# Altium footprint library PcbLib1.PcbLib: 54 footprints (part 2 of 4)
Each footprint in its own frame and in the unit in brackets; x right, y up, seen from the top. Pads: shape width x height; smd on the part's side, far side on the other; paste and mask are expansions set on the pad; w line width, h text height; cw(c..) or ccw(c..) is an arc to the next point about the centre after c.
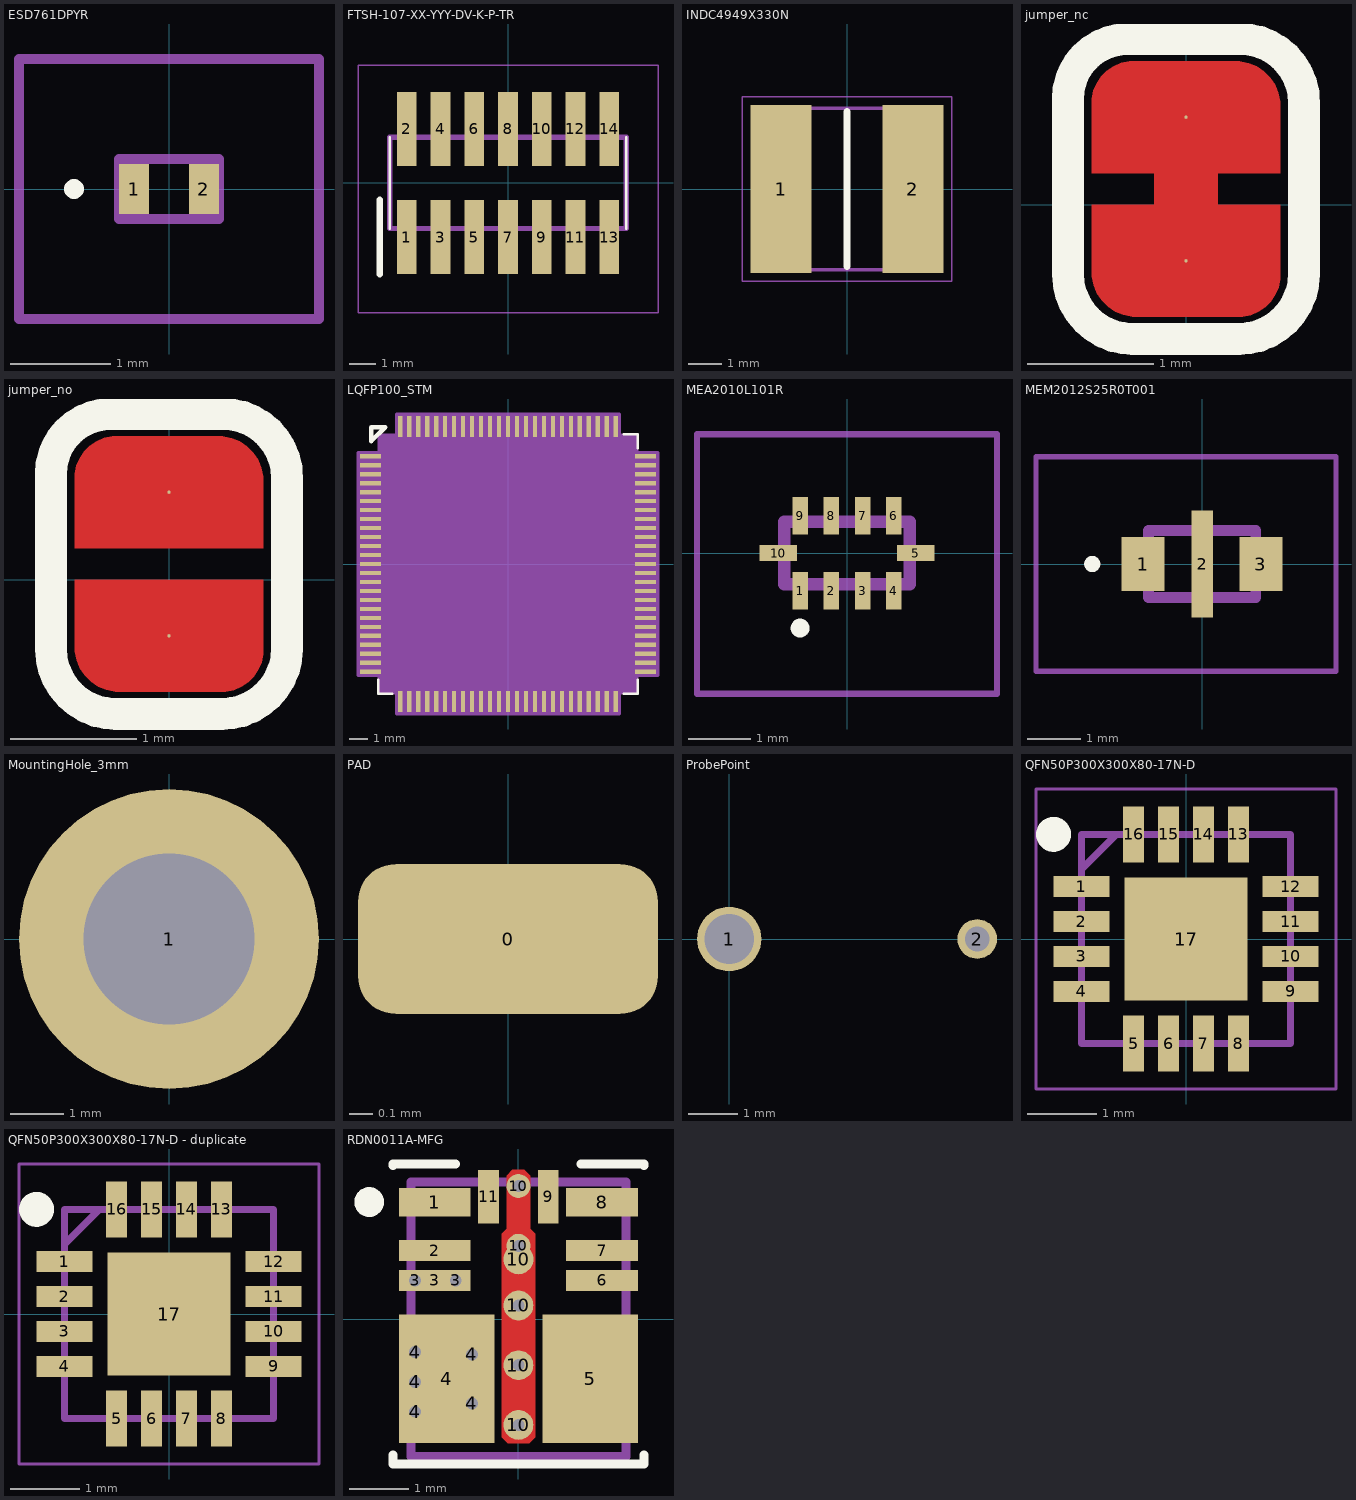
[diagram p1: the footprints below, top view; thin cyan lines are the x and y axes]

## ESD761DPYR [mm]
pads (2):
  rect 0.3x0.5 smd: 1(-0.35,0) 2(0.35,0)
Top Overlay:
  lines w0.1: -1,0 ccw(c-0.95,0) -0.9,0 ccw(c-0.95,0) -1,0
Mechanical 13:
  lines w0.1: -0.5,-0.3 0.5,-0.3 0.5,0.3 -0.5,0.3 -0.5,-0.3
Mechanical 15:
  lines w0.1: -1.5,-1.3 1.5,-1.3 1.5,1.3 -1.5,1.3 -1.5,-1.3
3D body "ESD761DPYR.stp": height 0.55, standoff 0, extent -0.5,-0.3 0.5,0.3

## FTSH-107-XX-YYY-DV-K-P-TR [mm]
pads (14):
  rect 0.74x2.79 smd: 1(-3.81,-2.035) 2(-3.81,2.035) 3(-2.54,-2.035) 4(-2.54,2.035) 5(-1.27,-2.035) 6(-1.27,2.035) 7(0,-2.035) 8(0,2.035) 9(1.27,-2.035) 10(1.27,2.035) 11(2.54,-2.035) 12(2.54,2.035) 13(3.81,-2.035) 14(3.81,2.035)
Top Overlay:
  lines w0.1: -4.445,-1.715 -4.445,1.715 ; 4.445,-1.715 4.445,1.715
  lines w0.254: -4.826,-3.429 -4.826,-0.635
Mechanical 13:
  lines w0.2: -4.445,-1.715 -4.445,1.715 4.445,1.715 4.445,-1.715 -4.445,-1.715
Mechanical 15:
  lines w0.05: -5.645,-4.885 -5.645,4.43 5.645,4.43 5.645,-4.885 -5.645,-4.885
3D body "FTSH-107-01-F-DV-K-P-TR.stp": height 6.99, standoff 0, extent -4.445,-4.425 4.445,2.941

## INDC4949X330N [mm]
pads (2):
  rect 1.85x5.1 smd: 1(-2,0) 2(2,0)
Top Overlay:
  lines w0.2: 0,-2.35 0,2.35
Mechanical 13:
  lines w0.1: -2.45,-2.45 -2.45,2.45 2.45,2.45 2.45,-2.45 -2.45,-2.45
Mechanical 15:
  lines w0.05: -3.175,-2.8 -3.175,2.8 3.175,2.8 3.175,-2.8 -3.175,-2.8
3D body "NRS5030T3R3MMGJ.stp": height 3.3, standoff 0, extent -2.45,-2.45 2.45,2.45

## jumper_nc [mil]
pads (2):
  round 1 smd: 1(0,27.5) 2(0,-17.5)
Top Layer:
  region: -10,-10 -10,20 10,20 10,-10
  region: 29.5,10 -29.5,10 -29.5,32 -29.5,33.28 -29,35.79 -28.02,38.16 -26.6,40.29 -24.79,42.1 -22.66,43.52 -20.29,44.5 -17.78,45 -16.5,45 15.5,45 16.88,45 19.58,44.46 22.13,43.41 24.42,41.87 26.37,39.92 27.91,37.63 28.96,35.08 29.5,32.38 29.5,31
  region: -29.5,0 29.5,0 29.5,-22 29.5,-23.28 29,-25.79 28.02,-28.16 26.6,-30.29 24.79,-32.1 22.66,-33.52 20.29,-34.5 17.78,-35 16.5,-35 -15.5,-35 -16.88,-35 -19.58,-34.46 -22.13,-33.41 -24.42,-31.87 -26.37,-29.92 -27.91,-27.63 -28.96,-25.08 -29.5,-22.38 -29.5,-21
Top Overlay:
  lines w10: -37,5 -37,-21.63 ccw(c-16.63,-21.63) -16.63,-42 16.51,-42 ccw(c16.51,-21.51) 37,-21.51 37,32 ccw(c17,32) 17,52 -18.25,52 ccw(c-18.25,33.25) -37,33.25 -37,6

## jumper_no [mil]
pads (2):
  round 1 smd: 1(0,27.5) 2(0,-17.5)
Top Layer:
  region: -29.5,0 29.5,0 29.5,-22 29.5,-23.28 29,-25.79 28.02,-28.16 26.6,-30.29 24.79,-32.1 22.66,-33.52 20.29,-34.5 17.78,-35 16.5,-35 -15.5,-35 -16.88,-35 -19.58,-34.46 -22.13,-33.41 -24.42,-31.87 -26.37,-29.92 -27.91,-27.63 -28.96,-25.08 -29.5,-22.38 -29.5,-21
  region: 29.5,10 -29.5,10 -29.5,32 -29.5,33.28 -29,35.79 -28.02,38.16 -26.6,40.29 -24.79,42.1 -22.66,43.52 -20.29,44.5 -17.78,45 -16.5,45 15.5,45 16.88,45 19.58,44.46 22.13,43.41 24.42,41.87 26.37,39.92 27.91,37.63 28.96,35.08 29.5,32.38 29.5,31
Top Overlay:
  lines w10: -37,5 -37,-21.63 ccw(c-16.63,-21.63) -16.63,-42 16.51,-42 ccw(c16.51,-21.51) 37,-21.51 37,32 ccw(c17,32) 17,52 -18.25,52 ccw(c-18.25,33.25) -37,33.25 -37,6

## LQFP100_STM [mil]
pads (100):
  rect 46x9 smd paste+0 mask+0: 1(-302,236.22) 2(-302,216.54) 3(-302,196.85) 4(-302,177.17) 5(-302,157.48) 6(-302,137.8) 7(-302,118.11) 8(-302,98.43) 9(-302,78.74) 10(-302,59.06) 11(-302,39.37) 12(-302,19.69) 13(-302,0) 14(-302,-19.68) 15(-302,-39.37) 16(-302,-59.06) 17(-302,-78.74) 18(-302,-98.43) 19(-302,-118.11) 20(-302,-137.8) 21(-302,-157.48) 22(-302,-177.17) 23(-302,-196.85) 24(-302,-216.54) 25(-302,-236.22) 51(302,-236.22) 52(302,-216.54) 53(302,-196.85) 54(302,-177.17) 55(302,-157.48) 56(302,-137.8) 57(302,-118.11) 58(302,-98.43) 59(302,-78.74) 60(302,-59.06) 61(302,-39.37) 62(302,-19.68) 63(302,0) 64(302,19.68) 65(302,39.37) 66(302,59.06) 67(302,78.74) 68(302,98.43) 69(302,118.11) 70(302,137.8) 71(302,157.48) 72(302,177.17) 73(302,196.85) 74(302,216.54) 75(302,236.22)
  rect 9x46 smd paste+0 mask+0: 26(-236.22,-302) 27(-216.54,-302) 28(-196.85,-302) 29(-177.17,-302) 30(-157.48,-302) 31(-137.8,-302) 32(-118.11,-302) 33(-98.43,-302) 34(-78.74,-302) 35(-59.06,-302) 36(-39.37,-302) 37(-19.68,-302) 38(0,-302) 39(19.68,-302) 40(39.37,-302) 41(59.06,-302) 42(78.74,-302) 43(98.43,-302) 44(118.11,-302) 45(137.8,-302) 46(157.48,-302) 47(177.17,-302) 48(196.85,-302) 49(216.54,-302) 50(236.22,-302) 76(236.22,302) 77(216.54,302) 78(196.85,302) 79(177.17,302) 80(157.48,302) 81(137.8,302) 82(118.11,302) 83(98.43,302) 84(78.74,302) 85(59.06,302) 86(39.37,302) 87(19.68,302) 88(0,302) 89(-19.68,302) 90(-39.37,302) 91(-59.06,302) 92(-78.74,302) 93(-98.43,302) 94(-118.11,302) 95(-137.8,302) 96(-157.48,302) 97(-177.17,302) 98(-196.85,302) 99(-216.54,302) 100(-236.22,302)
Top Overlay:
  lines w6: -300,269.66 -300,300.34 -269.32,300.34 ; -284.5,-253.82 -284.5,-284.5 -253.82,-284.5 ; 253.82,-284.5 284.5,-284.5 284.5,-253.82 ; 253.82,284.5 284.5,284.5 284.5,253.82
  lines w10: -300,269.66 -300,300.34 -269.32,300.34 -300,269.66
Mechanical 13:
  drawing of 405 lines, arcs and shapes, not listed
  text "*" at -277,221.06 h50
Mechanical 15:
  region: -244.72,-283.5 -283.5,-283.5 -283.5,-244.72 -329,-244.72 -329,244.72 -283.5,244.72 -283.5,283.5 -244.72,283.5 -244.72,329 244.72,329 244.72,283.5 283.5,283.5 283.5,244.72 329,244.72 329,-244.72 283.5,-244.72 283.5,-283.5 244.72,-283.5 244.72,-329 -244.72,-329
  lines w6: -329,-244.72 -283.5,-244.72 -283.5,-283.5 -244.72,-283.5 -244.72,-329 244.72,-329 244.72,-283.5 283.5,-283.5 283.5,-244.72 329,-244.72 329,244.72 283.5,244.72 283.5,283.5 244.72,283.5 244.72,329 -244.72,329 -244.72,283.5 -283.5,283.5 -283.5,244.72 -329,244.72 -329,-244.72
3D body "LQFP100_STM.step": height 63.11, standoff 0, extent -319.02,-319.02 319.02,319.02

## MEA2010L101R [mm]
pads (10):
  rect 0.25x0.6 smd: 1(-0.75,-0.6) 2(-0.25,-0.6) 3(0.25,-0.6) 4(0.75,-0.6) 6(0.75,0.6) 7(0.25,0.6) 8(-0.25,0.6) 9(-0.75,0.6)
  rect 0.6x0.25 smd: 5(1.1,0) 10(-1.1,0)
Top Overlay:
  lines w0.2: -0.8,-1.2 ccw(c-0.75,-1.2) -0.7,-1.2 ; -0.8,-1.2 cw(c-0.75,-1.2) -0.7,-1.2 ; -0.8,-1.2 ccw(c-0.75,-1.2) -0.7,-1.2
Mechanical 13:
  lines w0.2: -1,-0.5 1,-0.5 1,0.5 -1,0.5 -1,-0.5
Mechanical 15:
  lines w0.1: -2.4,-2.25 2.4,-2.25 2.4,1.9 -2.4,1.9 -2.4,-2.25
3D body "MEA2010L101R.stp": height 0.9, standoff 0, extent -1.375,-0.875 1.375,0.875

## MEM2012S25R0T001 [mm]
pads (3):
  rect 0.8x1 smd: 1(-1.1,0) 3(1.1,0)
  rect 0.4x2 smd: 2(0,0)
Top Overlay:
  lines w0.2: -2.1,0 ccw(c-2.05,0) -2,0 ccw(c-2.05,0) -2.1,0
Mechanical 13:
  lines w0.2: -1,-0.625 -1,0.625 1,0.625 1,-0.625 -1,-0.625
Mechanical 15:
  lines w0.1: -3.1,-2 -3.1,2 2.5,2 2.5,-2 -3.1,-2
3D body "MEM2012S25R0T001.stp": height 1, standoff 0, extent -1,-0.625 1,0.625

## MountingHole_3mm [mm]
pads (1):
  round 5.6 hole 3.2: 1(0,0)

## PAD [mm]
pads (1):
  rrect50% 1.27x0.635 smd: 0(0,0)

## PCBComponent_1 [mm]

## PCBComponent_1 - duplicate [mm]

## ProbePoint [mm]
pads (2):
  round 1.3 hole 1: 1(0,0)
  round 0.8 hole 0.5: 2(5,0)

## QFN50P300X300X80-17N-D [mm]
pads (17):
  rect 0.8x0.3 smd: 1(-1.5,0.75) 2(-1.5,0.25) 3(-1.5,-0.25) 4(-1.5,-0.75) 9(1.5,-0.75) 10(1.5,-0.25) 11(1.5,0.25) 12(1.5,0.75)
  rect 0.3x0.8 smd: 5(-0.75,-1.5) 6(-0.25,-1.5) 7(0.25,-1.5) 8(0.75,-1.5) 13(0.75,1.5) 14(0.25,1.5) 15(-0.25,1.5) 16(-0.75,1.5)
  rect 1.76x1.76 smd mask+0.2: 17(0,0)
Top Overlay:
  circle w0.25: c-1.9,1.5 r0.125
Mechanical 13:
  lines w0.1: -1.5,1 -1,1.5 ; -1.5,-1.5 1.5,-1.5 1.5,1.5 -1.5,1.5 -1.5,-1.5
Mechanical 15:
  lines w0.05: -2.15,-2.15 2.15,-2.15 2.15,2.15 -2.15,2.15 -2.15,-2.15
3D body "ADS7138QRTERQ1.stp": height 0.8, standoff 0, extent -1.5,-1.5 1.5,1.5

## QFN50P300X300X80-17N-D - duplicate [mm]
pads (17):
  rect 0.8x0.3 smd: 1(-1.5,0.75) 2(-1.5,0.25) 3(-1.5,-0.25) 4(-1.5,-0.75) 9(1.5,-0.75) 10(1.5,-0.25) 11(1.5,0.25) 12(1.5,0.75)
  rect 0.3x0.8 smd: 5(-0.75,-1.5) 6(-0.25,-1.5) 7(0.25,-1.5) 8(0.75,-1.5) 13(0.75,1.5) 14(0.25,1.5) 15(-0.25,1.5) 16(-0.75,1.5)
  rect 1.76x1.76 smd mask+0.2: 17(0,0)
Top Overlay:
  circle w0.25: c-1.9,1.5 r0.125
Mechanical 13:
  lines w0.1: -1.5,1 -1,1.5 ; -1.5,-1.5 1.5,-1.5 1.5,1.5 -1.5,1.5 -1.5,-1.5
Mechanical 15:
  lines w0.05: -2.15,-2.15 2.15,-2.15 2.15,2.15 -2.15,2.15 -2.15,-2.15
3D body "ADS7138QRTERQ1.stp": height 0.8, standoff 0, extent -1.5,-1.5 1.5,1.5

## RDN0011A-MFG [mm]
pads (24):
  rect 1.2x0.475 smd paste-0.587 mask-0.584: 1(-1.4,1.962) 8(1.4,1.962)
  rect 1.2x0.35 smd paste-0.587 mask-0.584: 2(-1.4,1.15) 3(-1.4,0.65) 6(1.4,0.65) 7(1.4,1.15)
  round 0.35 hole 0.2 paste-2539.97 mask-0.165: 3(-1.73,0.65) 3(-1.05,0.65)
  round 0.5 hole 0.2 paste-2539.97 mask-0.241: 4(-1.73,-1.55) 4(-1.73,-1.05) 4(-1.73,-0.55) 4(-0.78,-1.41) 4(-0.78,-0.59) 10(0,-1.77) 10(0,-0.77) 10(0,0.23)
  rect 1.6x2.15 smd paste-1.062 mask-1.067: 4(-1.2,-1) 5(1.2,-1)
  rect 0.35x0.9 smd paste-0.437 mask-0.432: 9(0.5,2.05) 11(-0.5,2.05)
  round 0.025 smd mask+0: 10(0,0.212)
  round 0.504 smd paste-0.239 mask-0.241: 10(0,1.005)
  round 0.4 hole 0.2 paste-2539.97 mask-0.191: 10(0,1.23) 10(0,2.23)
Top Layer:
  region: -0.2,1.515 -0.2,2.4 -0.1,2.5 0.1,2.5 0.2,2.4 0.2,1.515 0.24,1.475 0.28,1.435 0.28,-1.975 0.18,-2.075 -0.18,-2.075 -0.28,-1.975 -0.28,1.435 -0.24,1.475
Top Overlay:
  circle w0.25: c-2.5,1.962 r0.125
  lines w0.15: -2.1,-2.275 -2.1,-2.425 2.1,-2.425 2.1,-2.275 ; -2.1,2.575 -2.1,2.6 -1.05,2.6 ; 1.05,2.6 2.1,2.6 2.1,2.575
Top Paste:
  drawing of 23 lines, arcs and shapes, not listed
Top Solder:
  region: -1.95,1.824 -1.95,2.1 -1.9,2.15 -0.9,2.15 -0.85,2.1 -0.85,1.824 -0.9,1.774 -1.9,1.774
  region: 1.9,2.15 1.95,2.1 1.95,1.824 1.9,1.774 0.9,1.774 0.85,1.824 0.85,2.1 0.9,2.15
  region: 0.9,1.025 0.85,1.075 0.85,1.225 0.9,1.275 1.9,1.275 1.95,1.225 1.95,1.075 1.9,1.025
  region: -0.9,1.025 -1.9,1.025 -1.95,1.075 -1.95,1.225 -1.9,1.275 -0.9,1.275 -0.85,1.225 -0.85,1.075
  region: -1.9,0.775 -0.9,0.775 -0.85,0.725 -0.85,0.575 -0.9,0.525 -1.9,0.525 -1.95,0.575 -1.95,0.725
  region: 0.85,0.575 0.85,0.725 0.9,0.775 1.9,0.775 1.95,0.725 1.95,0.575 1.9,0.525 0.9,0.525
  region: 0.625,1.7 0.575,1.65 0.425,1.65 0.375,1.7 0.375,2.4 0.425,2.45 0.575,2.45 0.625,2.4
  region: -0.375,1.7 -0.425,1.65 -0.575,1.65 -0.625,1.7 -0.625,2.4 -0.575,2.45 -0.425,2.45 -0.375,2.4
  region: 1.525,-2.025 0.5,-2.025 0.5,0.025 1.525,0.025 1.575,-0.025 1.575,-0.125 1.625,-0.175 1.9,-0.175 1.95,-0.225 1.95,-0.375 1.9,-0.425 1.625,-0.425 1.575,-0.475 1.575,-0.625 1.625,-0.675 1.9,-0.675 1.95,-0.725 1.95,-0.875 1.9,-0.925 1.625,-0.925 1.575,-0.975 1.575,-1.125 1.625,-1.175 1.9,-1.175 1.95,-1.225 1.95,-1.375 1.9,-1.425 1.625,-1.425 1.575,-1.475 1.575,-1.625 1.625,-1.675 1.9,-1.675 1.95,-1.725 1.95,-1.875 1.9,-1.925 1.625,-1.925 1.575,-1.975
  region: -1.525,-2.025 -0.5,-2.025 -0.5,0.025 -1.525,0.025 -1.575,-0.025 -1.575,-0.125 -1.625,-0.175 -1.9,-0.175 -1.95,-0.225 -1.95,-0.375 -1.9,-0.425 -1.625,-0.425 -1.575,-0.475 -1.575,-0.625 -1.625,-0.675 -1.9,-0.675 -1.95,-0.725 -1.95,-0.875 -1.9,-0.925 -1.625,-0.925 -1.575,-0.975 -1.575,-1.125 -1.625,-1.175 -1.9,-1.175 -1.95,-1.225 -1.95,-1.375 -1.9,-1.425 -1.625,-1.425 -1.575,-1.475 -1.575,-1.625 -1.625,-1.675 -1.9,-1.675 -1.95,-1.725 -1.95,-1.875 -1.9,-1.925 -1.625,-1.925 -1.575,-1.975
  region: -0.15,0.974 -0.15,2.399 -0.1,2.449 0.1,2.449 0.15,2.399 0.15,0.974 0.1,0.924 -0.1,0.924
Mechanical 13:
  lines w0.15: -1.8,-2.3 1.8,-2.3 1.8,2.3 -1.8,2.3 -1.8,-2.3
3D body "TPSM33615FRDNR.stp": height 2.03, standoff 0.03, extent -1.814,-2.187 1.706,2.323